# Altium schematic symbol library SparkFun-Aesthetics.SCHLIB: 129 symbols (continued)
## FRAME-LETTERNO_PACKAGE (continued)
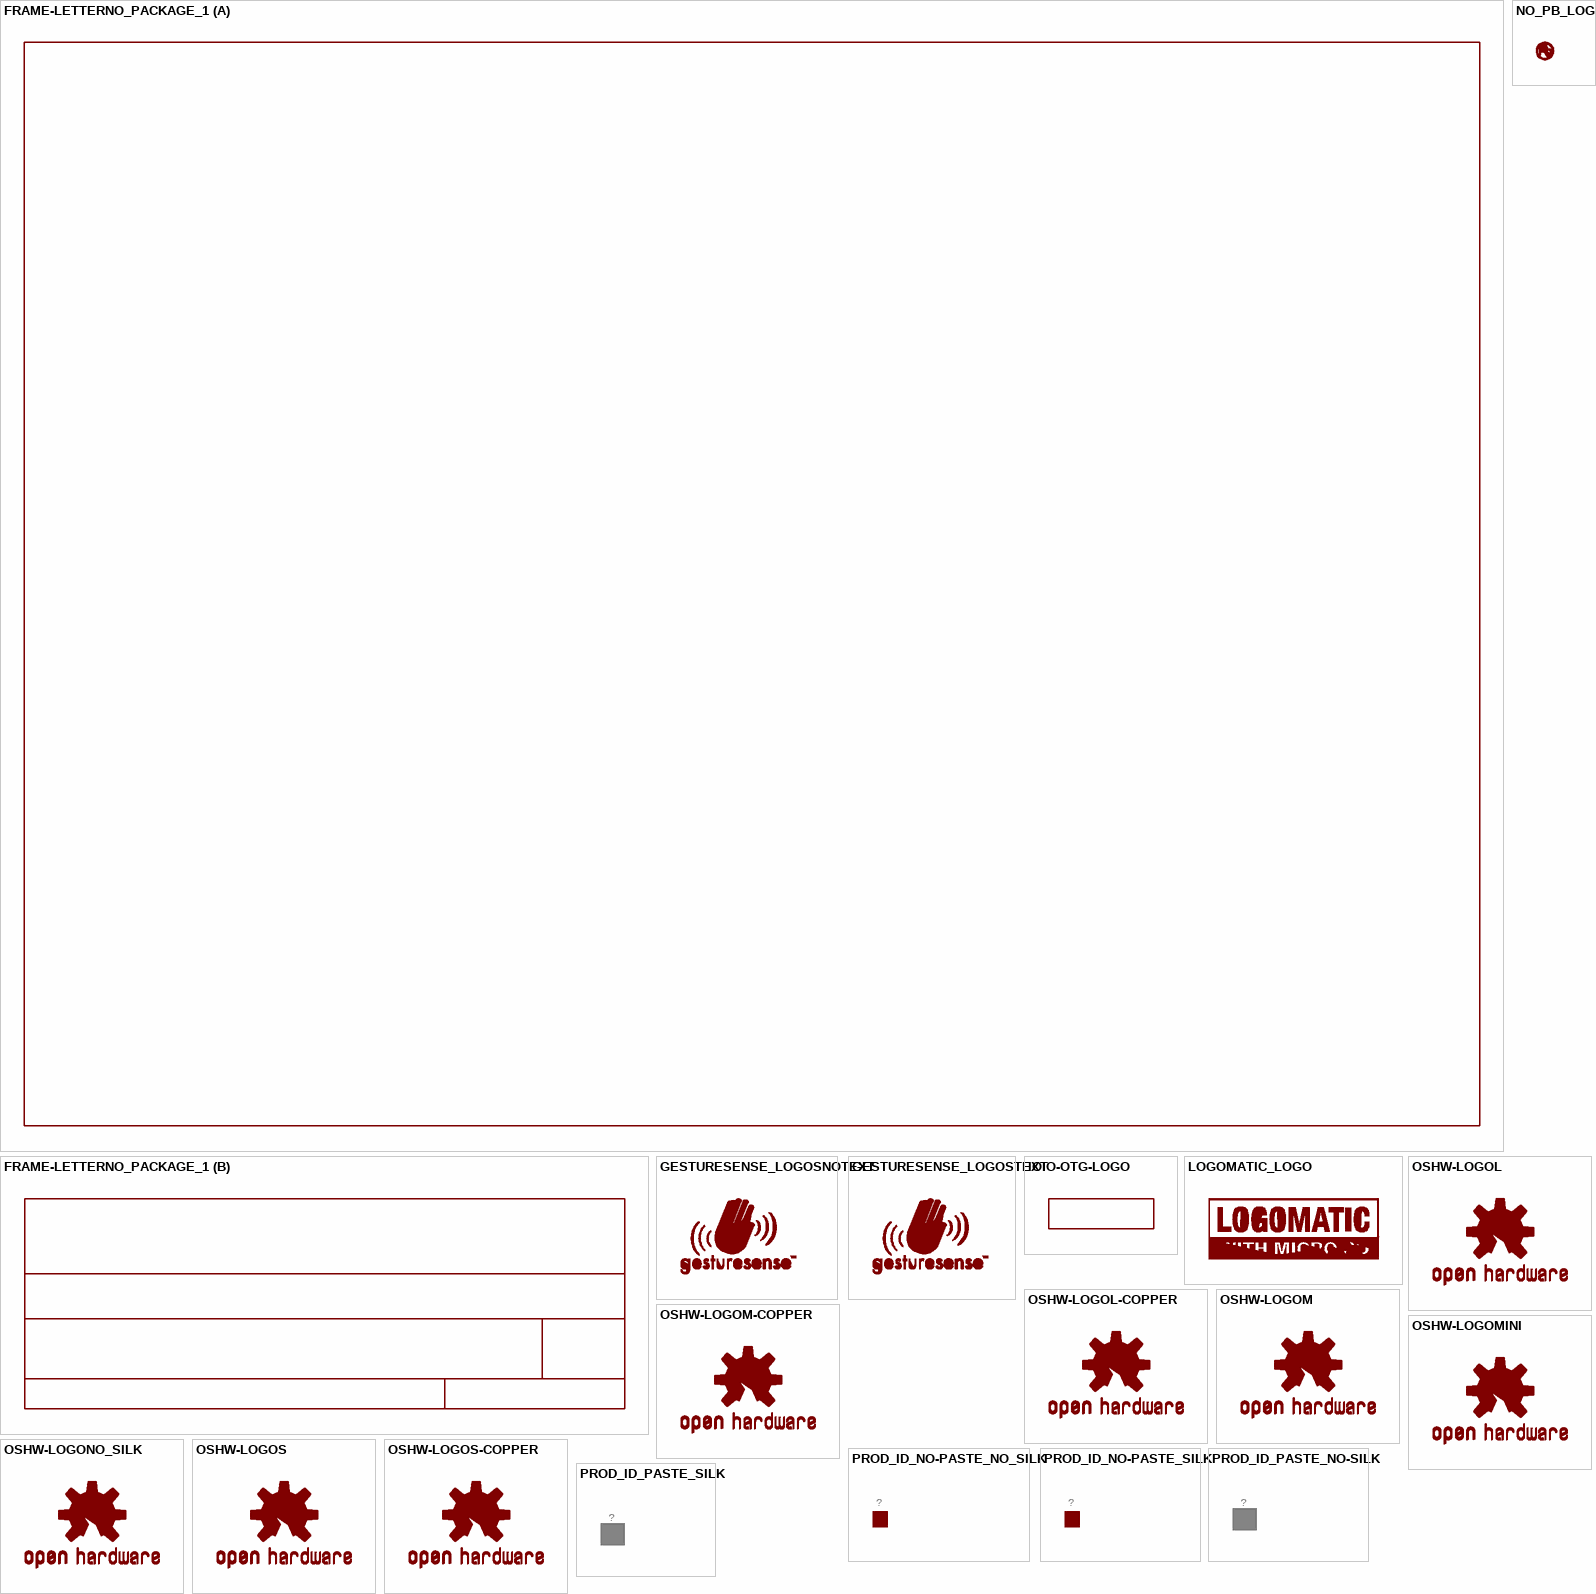
[diagram p8: symbols FRAME-LETTERNO_PACKAGE_1 to PROD_ID_PASTE_SILK]

## FRAME-LETTERNO_PACKAGE_1
designator FRAME?, comment Schematic Frame - Letter    Standard 8.5x11 US Letter frame  (value not drawn)
GateName_1: G$1; GateName_2: V; SymbolName_2: DOCFIELD; DeviceName: NO_PACKAGE; DESIGNER: Nobody; SymbolName_1: FRAME-LETTER; LibraryName: SparkFun-Aesthetics; DeviceSetName: FRAME-LETTER; Package: DUMMY; VERSION: v01
footprint DUMMY

## GESTURESENSE_LOGOSNOTEXT
designator LOGO?, comment GestureSense Logo    Used on the ZX Distance and Gesture Sensor.  (value not drawn)
GateName_1: G$1; DeviceName: NOTEXT; DeviceSetName: GESTURESENSE_LOGOS; SymbolName_1: GESTURESENSE; LibraryName: SparkFun-Aesthetics; Package: GESTURESENSE_NOTEXT
footprint GESTURESENSE_NOTEXT

## GESTURESENSE_LOGOSTEXT
designator LOGO?, comment GestureSense Logo    Used on the ZX Distance and Gesture Sensor.  (value not drawn)
GateName_1: G$1; DeviceName: TEXT; DeviceSetName: GESTURESENSE_LOGOS; SymbolName_1: GESTURESENSE; LibraryName: SparkFun-Aesthetics; Package: GESTURESENSE_TEXT
footprint GESTURESENSE_TEXT

## IOIO-OTG-LOGO
designator LOGO?, comment IOIO OTG Logo - Exposed Copper    Logo used on the SparkFun IOIO-OTG.  (value not drawn)
GateName_1: G$1; DeviceSetName: IOIO-OTG-LOGO; SymbolName_1: IOIO-OTG; LibraryName: SparkFun-Aesthetics; Package: IOIO-OTG-COPPER-EXPOSED
footprint IOIO-OTG-COPPER-EXPOSED

## LOGO-CONTROLLER_BIT
designator ?
GateName_1: G$1; SymbolName_1: LOGO-CONTROLLER_BIT; LibraryName: SparkFun-Aesthetics; DeviceSetName: LOGO-CONTROLLER_BIT; Package: LOGO-CONTROLLER_BIT
footprint LOGO-CONTROLLER_BIT

## LOGOMATIC_LOGO
designator LOGO?, comment SparkFun Logomatic Logo - Silkscreen    Logo used on the SparkFun Logomatic v2.   Silk is .4" by 1.1" Board logo is .4" by 1.1"  (value not drawn)
GateName_1: G$1; SymbolName_1: LOGOMATIC_LOGO; LibraryName: SparkFun-Aesthetics; DeviceSetName: LOGOMATIC_LOGO; Package: LOGOMATIC_LOGO
footprint LOGOMATIC_LOGO

## NO_PB_LOGO
designator LOGO?, comment Lead-Free (No Pb) Logo    Logo for lead-safe certified hardware.  (value not drawn)
GateName_1: G$1; SymbolName_1: NO_PB_LOGO; LibraryName: SparkFun-Aesthetics; DeviceSetName: NO_PB_LOGO; Package: NO_PB_LOGO_0.120
footprint NO_PB_LOGO_0.120

## OSHW-LOGOL
designator LOGO?, comment Open-Source Hardware (OSHW) Logo     This logo indicates the piece of hardware it is found on incorporates a OSHW license and/or adheres to the definition of open source hardware found here: http://freedomdefined.org/OSHW  (value not drawn)
GateName_1: G$1; SymbolName_1: OSHW-LOGO; DeviceName: L; LibraryName: SparkFun-Aesthetics; DeviceSetName: OSHW-LOGO; Package: OSHW-LOGO-L
footprint OSHW-LOGO-L

## OSHW-LOGOL-COPPER
designator LOGO?, comment Open-Source Hardware (OSHW) Logo     This logo indicates the piece of hardware it is found on incorporates a OSHW license and/or adheres to the definition of open source hardware found here: http://freedomdefined.org/OSHW  (value not drawn)
GateName_1: G$1; SymbolName_1: OSHW-LOGO; DeviceName: L-COPPER; LibraryName: SparkFun-Aesthetics; DeviceSetName: OSHW-LOGO; Package: OSHW-LOGO-L_COPPER
footprint OSHW-LOGO-L_COPPER

## OSHW-LOGOM
designator LOGO?, comment Open-Source Hardware (OSHW) Logo     This logo indicates the piece of hardware it is found on incorporates a OSHW license and/or adheres to the definition of open source hardware found here: http://freedomdefined.org/OSHW  (value not drawn)
GateName_1: G$1; SymbolName_1: OSHW-LOGO; DeviceName: M; LibraryName: SparkFun-Aesthetics; DeviceSetName: OSHW-LOGO; Package: OSHW-LOGO-M
footprint OSHW-LOGO-M

## OSHW-LOGOM-COPPER
designator LOGO?, comment Open-Source Hardware (OSHW) Logo     This logo indicates the piece of hardware it is found on incorporates a OSHW license and/or adheres to the definition of open source hardware found here: http://freedomdefined.org/OSHW  (value not drawn)
GateName_1: G$1; SymbolName_1: OSHW-LOGO; DeviceName: M-COPPER; LibraryName: SparkFun-Aesthetics; DeviceSetName: OSHW-LOGO; Package: OSHW-LOGO-M_COPPER
footprint OSHW-LOGO-M_COPPER

## OSHW-LOGOMINI
designator LOGO?, comment Open-Source Hardware (OSHW) Logo     This logo indicates the piece of hardware it is found on incorporates a OSHW license and/or adheres to the definition of open source hardware found here: http://freedomdefined.org/OSHW  (value not drawn)
GateName_1: G$1; SymbolName_1: OSHW-LOGO; DeviceName: MINI; LibraryName: SparkFun-Aesthetics; DeviceSetName: OSHW-LOGO; Package: OSHW-LOGO-MINI
footprint OSHW-LOGO-MINI

## OSHW-LOGONO_SILK
designator LOGO?, comment Open-Source Hardware (OSHW) Logo     This logo indicates the piece of hardware it is found on incorporates a OSHW license and/or adheres to the definition of open source hardware found here: http://freedomdefined.org/OSHW  (value not drawn)
GateName_1: G$1; SymbolName_1: OSHW-LOGO; DeviceName: NO_SILK; LibraryName: SparkFun-Aesthetics; DeviceSetName: OSHW-LOGO; Package: DUMMY
footprint DUMMY

## OSHW-LOGOS
designator LOGO?, comment Open-Source Hardware (OSHW) Logo     This logo indicates the piece of hardware it is found on incorporates a OSHW license and/or adheres to the definition of open source hardware found here: http://freedomdefined.org/OSHW  (value not drawn)
GateName_1: G$1; SymbolName_1: OSHW-LOGO; DeviceName: S; LibraryName: SparkFun-Aesthetics; DeviceSetName: OSHW-LOGO; Package: OSHW-LOGO-S
footprint OSHW-LOGO-S

## OSHW-LOGOS-COPPER
designator LOGO?, comment Open-Source Hardware (OSHW) Logo     This logo indicates the piece of hardware it is found on incorporates a OSHW license and/or adheres to the definition of open source hardware found here: http://freedomdefined.org/OSHW  (value not drawn)
GateName_1: G$1; SymbolName_1: OSHW-LOGO; DeviceName: S-COPPER; LibraryName: SparkFun-Aesthetics; DeviceSetName: OSHW-LOGO; Package: OSHW-LOGO-S_COPPER
footprint OSHW-LOGO-S_COPPER

## PROD_ID_NO-PASTE_NO_SILK
designator ?
GateName_1: G$1; SymbolName_1: PRODUCT_IDENT_NO; DeviceName: _NO_SILK; DeviceSetName: PROD_ID_NO-PASTE; LibraryName: SparkFun-Aesthetics; Package: PRODUCT_IDENT_NO_NO-SILK
footprint PRODUCT_IDENT_NO_NO-SILK

## PROD_ID_NO-PASTE_SILK
designator ?
GateName_1: G$1; SymbolName_1: PRODUCT_IDENT_NO; DeviceName: _SILK; DeviceSetName: PROD_ID_NO-PASTE; LibraryName: SparkFun-Aesthetics; Package: PRODUCT_IDENT_NO_SILK
footprint PRODUCT_IDENT_NO_SILK

## PROD_ID_PASTE_NO-SILK
designator ?
GateName_1: G$1; SymbolName_1: PRODUCT_IDENT_PASTE; DeviceName: _NO-SILK; DeviceSetName: PROD_ID_PASTE; LibraryName: SparkFun-Aesthetics; Package: PRODUCT_IDENT_PASTE_NO-SILK
footprint PRODUCT_IDENT_PASTE_NO-SILK

## PROD_ID_PASTE_SILK
designator ?
GateName_1: G$1; SymbolName_1: PRODUCT_IDENT_PASTE; DeviceName: _SILK; DeviceSetName: PROD_ID_PASTE; LibraryName: SparkFun-Aesthetics; Package: PRODUCT_IDENT_PASTE_SILK
footprint PRODUCT_IDENT_PASTE_SILK

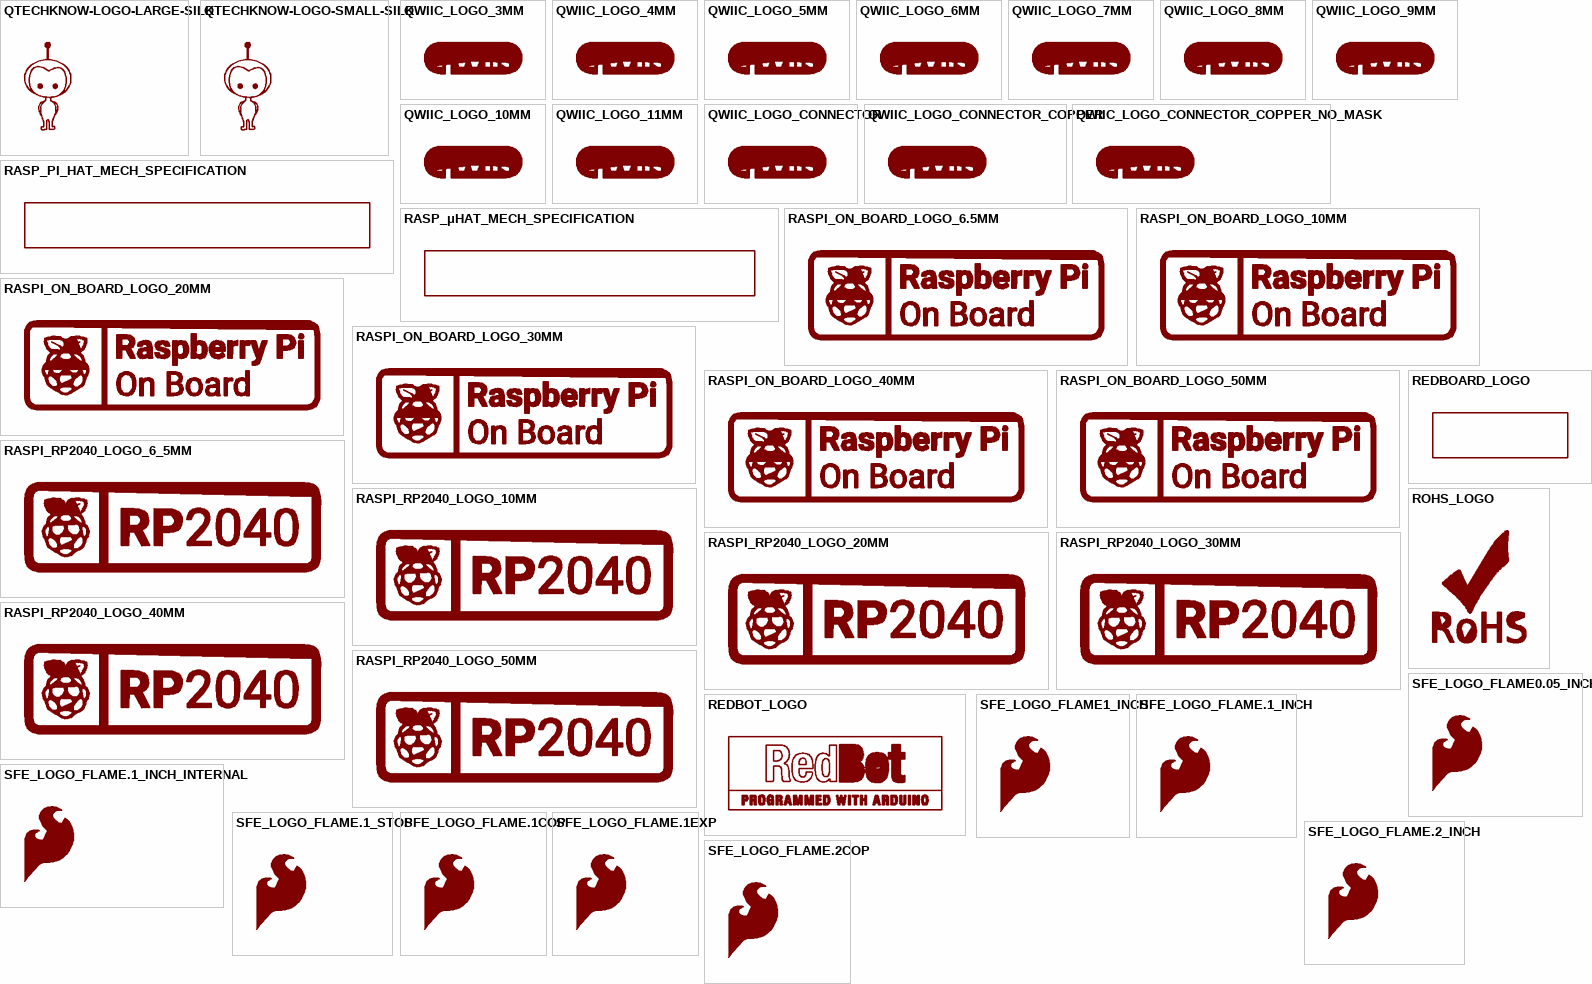
[diagram p9: symbols QTECHKNOW-LOGO-LARGE-SILK to SFE_LOGO_FLAME.2COP]

## QTECHKNOW-LOGO-LARGE-SILK
designator LOGO?, comment Qtechknow "MightyQ" Logo    Silkscreen logo used on the Qduino Mini.  (value not drawn)
GateName_1: G$1; DeviceName: -LARGE-SILK; DeviceSetName: QTECHKNOW-LOGO; SymbolName_1: MIGHTYQ; LibraryName: SparkFun-Aesthetics; Package: QTECHKNOW-LOGO-LARGE-SILK
footprint QTECHKNOW-LOGO-LARGE-SILK

## QTECHKNOW-LOGO-SMALL-SILK
designator LOGO?, comment Qtechknow "MightyQ" Logo    Silkscreen logo used on the Qduino Mini.  (value not drawn)
GateName_1: G$1; DeviceName: -SMALL-SILK; DeviceSetName: QTECHKNOW-LOGO; SymbolName_1: MIGHTYQ; LibraryName: SparkFun-Aesthetics; Package: QTECHKNOW-LOGO-SMALL-SILK
footprint QTECHKNOW-LOGO-SMALL-SILK

## QWIIC_LOGO_3MM
designator LOGO?, comment Qwiic Logos for placement on schematic and PCB. The 5.5mm silk logo is best for placing next to Qwiic connector.  (value not drawn)
GateName_1: G$1; DeviceName: _3MM; DeviceSetName: QWIIC_LOGO; SymbolName_1: LOGO; LibraryName: SparkFun-Aesthetics; Package: QWIIC_3MM
footprint QWIIC_3MM

## QWIIC_LOGO_4MM
designator LOGO?, comment Qwiic Logos for placement on schematic and PCB. The 5.5mm silk logo is best for placing next to Qwiic connector.  (value not drawn)
GateName_1: G$1; DeviceName: _4MM; DeviceSetName: QWIIC_LOGO; SymbolName_1: LOGO; LibraryName: SparkFun-Aesthetics; Package: QWIIC_4MM
footprint QWIIC_4MM

## QWIIC_LOGO_5MM
designator LOGO?, comment Qwiic Logos for placement on schematic and PCB. The 5.5mm silk logo is best for placing next to Qwiic connector.  (value not drawn)
GateName_1: G$1; DeviceName: _5MM; DeviceSetName: QWIIC_LOGO; SymbolName_1: LOGO; LibraryName: SparkFun-Aesthetics; Package: QWIIC_5MM
footprint QWIIC_5MM

## QWIIC_LOGO_6MM
designator LOGO?, comment Qwiic Logos for placement on schematic and PCB. The 5.5mm silk logo is best for placing next to Qwiic connector.  (value not drawn)
GateName_1: G$1; DeviceName: _6MM; DeviceSetName: QWIIC_LOGO; SymbolName_1: LOGO; LibraryName: SparkFun-Aesthetics; Package: QWIIC_6MM
footprint QWIIC_6MM

## QWIIC_LOGO_7MM
designator LOGO?, comment Qwiic Logos for placement on schematic and PCB. The 5.5mm silk logo is best for placing next to Qwiic connector.  (value not drawn)
GateName_1: G$1; DeviceName: _7MM; DeviceSetName: QWIIC_LOGO; SymbolName_1: LOGO; LibraryName: SparkFun-Aesthetics; Package: QWIIC_7MM
footprint QWIIC_7MM

## QWIIC_LOGO_8MM
designator LOGO?, comment Qwiic Logos for placement on schematic and PCB. The 5.5mm silk logo is best for placing next to Qwiic connector.  (value not drawn)
GateName_1: G$1; DeviceName: _8MM; DeviceSetName: QWIIC_LOGO; SymbolName_1: LOGO; LibraryName: SparkFun-Aesthetics; Package: QWIIC_8MM
footprint QWIIC_8MM

## QWIIC_LOGO_9MM
designator LOGO?, comment Qwiic Logos for placement on schematic and PCB. The 5.5mm silk logo is best for placing next to Qwiic connector.  (value not drawn)
GateName_1: G$1; DeviceName: _9MM; DeviceSetName: QWIIC_LOGO; SymbolName_1: LOGO; LibraryName: SparkFun-Aesthetics; Package: QWIIC_9MM
footprint QWIIC_9MM

## QWIIC_LOGO_10MM
designator LOGO?, comment Qwiic Logos for placement on schematic and PCB. The 5.5mm silk logo is best for placing next to Qwiic connector.  (value not drawn)
GateName_1: G$1; DeviceName: _10MM; DeviceSetName: QWIIC_LOGO; SymbolName_1: LOGO; LibraryName: SparkFun-Aesthetics; Package: QWIIC_10MM
footprint QWIIC_10MM

## QWIIC_LOGO_11MM
designator LOGO?, comment Qwiic Logos for placement on schematic and PCB. The 5.5mm silk logo is best for placing next to Qwiic connector.  (value not drawn)
GateName_1: G$1; DeviceName: _11MM; DeviceSetName: QWIIC_LOGO; SymbolName_1: LOGO; LibraryName: SparkFun-Aesthetics; Package: QWIIC_11MM
footprint QWIIC_11MM

## QWIIC_LOGO_CONNECTOR
designator LOGO?, comment Qwiic Logos for placement on schematic and PCB. The 5.5mm silk logo is best for placing next to Qwiic connector.  (value not drawn)
GateName_1: G$1; DeviceName: _CONNECTOR; DeviceSetName: QWIIC_LOGO; SymbolName_1: LOGO; LibraryName: SparkFun-Aesthetics; Package: QWIIC_5.5MM
footprint QWIIC_5.5MM

## QWIIC_LOGO_CONNECTOR_COPPER
designator LOGO?, comment Qwiic Logos for placement on schematic and PCB. The 5.5mm silk logo is best for placing next to Qwiic connector.  (value not drawn)
GateName_1: G$1; DeviceName: _CONNECTOR_COPPER; DeviceSetName: QWIIC_LOGO; SymbolName_1: LOGO; LibraryName: SparkFun-Aesthetics; Package: QWIIC_5.5MM_COPPER
footprint QWIIC_5.5MM_COPPER

## QWIIC_LOGO_CONNECTOR_COPPER_NO_MASK
designator LOGO?, comment Qwiic Logos for placement on schematic and PCB. The 5.5mm silk logo is best for placing next to Qwiic connector.  (value not drawn)
GateName_1: G$1; DeviceName: _CONNECTOR_COPPER_NO_MASK; DeviceSetName: QWIIC_LOGO; SymbolName_1: LOGO; LibraryName: SparkFun-Aesthetics; Package: QWIIC_5.5MM_COPPER_NO_MASK
footprint QWIIC_5.5MM_COPPER_NO_MASK

## RASP_PI_HAT_MECH_SPECIFICATION
designator ?
GateName_1: G$1; SymbolName_1: RASP_PI_HAT_SPECIFICATION; DeviceSetName: RASP_PI_HAT_MECH_SPECIFICATION; LibraryName: SparkFun-Aesthetics; Package: RASP_PI_HAT_SPECIFICATION
footprint RASP_PI_HAT_SPECIFICATION

## RASP_μHAT_MECH_SPECIFICATION
designator ?, comment Mechanical Specification for Raspberry Î¼Hat    The mechanical specification was pulled from their Github page.  (value not drawn)
GateName_1: G$1; SymbolName_1: RASP_μHAT_SPECIFICATION; DeviceSetName: RASP_μHAT_MECH_SPECIFICATION; LibraryName: SparkFun-Aesthetics; Package: RASP_μPI_HAT_SPECIFICATION
footprint RASP_μPI_HAT_SPECIFICATION

## RASPI_ON_BOARD_LOGO_6.5MM
designator ?
GateName_1: G$1; SymbolName_1: RASPI_ON_BOARD_LOGO; DeviceName: _6.5MM; LibraryName: SparkFun-Aesthetics; DeviceSetName: RASPI_ON_BOARD_LOGO; Package: RASPI_ON_BOARD_LOGO_6_5MM
footprint RASPI_ON_BOARD_LOGO_6_5MM

## RASPI_ON_BOARD_LOGO_10MM
designator ?
GateName_1: G$1; SymbolName_1: RASPI_ON_BOARD_LOGO; DeviceName: _10MM; LibraryName: SparkFun-Aesthetics; DeviceSetName: RASPI_ON_BOARD_LOGO; Package: RASPI_ON_BOARD_LOGO_10MM
footprint RASPI_ON_BOARD_LOGO_10MM

## RASPI_ON_BOARD_LOGO_20MM
designator ?
GateName_1: G$1; SymbolName_1: RASPI_ON_BOARD_LOGO; DeviceName: _20MM; LibraryName: SparkFun-Aesthetics; DeviceSetName: RASPI_ON_BOARD_LOGO; Package: RASPI_ON_BOARD_LOGO_20MM
footprint RASPI_ON_BOARD_LOGO_20MM

## RASPI_ON_BOARD_LOGO_30MM
designator ?
GateName_1: G$1; SymbolName_1: RASPI_ON_BOARD_LOGO; DeviceName: _30MM; LibraryName: SparkFun-Aesthetics; DeviceSetName: RASPI_ON_BOARD_LOGO; Package: RASPI_ON_BOARD_LOGO_30MM
footprint RASPI_ON_BOARD_LOGO_30MM

## RASPI_ON_BOARD_LOGO_40MM
designator ?
GateName_1: G$1; SymbolName_1: RASPI_ON_BOARD_LOGO; DeviceName: _40MM; LibraryName: SparkFun-Aesthetics; DeviceSetName: RASPI_ON_BOARD_LOGO; Package: RASPI_ON_BOARD_LOGO_40MM
footprint RASPI_ON_BOARD_LOGO_40MM

## RASPI_ON_BOARD_LOGO_50MM
designator ?
GateName_1: G$1; SymbolName_1: RASPI_ON_BOARD_LOGO; DeviceName: _50MM; LibraryName: SparkFun-Aesthetics; DeviceSetName: RASPI_ON_BOARD_LOGO; Package: RASPI_ON_BOARD_LOGO_50MM
footprint RASPI_ON_BOARD_LOGO_50MM

## RASPI_RP2040_LOGO_6_5MM
designator ?
GateName_1: G$1; SymbolName_1: RASPI_RP2040_LOGO; DeviceName: _6_5MM; LibraryName: SparkFun-Aesthetics; DeviceSetName: RASPI_RP2040_LOGO; Package: RASPI_RP2040_LOGO_6_5MM
footprint RASPI_RP2040_LOGO_6_5MM

## RASPI_RP2040_LOGO_10MM
designator ?
GateName_1: G$1; SymbolName_1: RASPI_RP2040_LOGO; DeviceName: _10MM; LibraryName: SparkFun-Aesthetics; DeviceSetName: RASPI_RP2040_LOGO; Package: RASPI_RP2040_LOGO_10MM
footprint RASPI_RP2040_LOGO_10MM

## RASPI_RP2040_LOGO_20MM
designator ?
GateName_1: G$1; SymbolName_1: RASPI_RP2040_LOGO; DeviceName: _20MM; LibraryName: SparkFun-Aesthetics; DeviceSetName: RASPI_RP2040_LOGO; Package: RASPI_RP2040_LOGO_20MM
footprint RASPI_RP2040_LOGO_20MM

## RASPI_RP2040_LOGO_30MM
designator ?
GateName_1: G$1; SymbolName_1: RASPI_RP2040_LOGO; DeviceName: _30MM; LibraryName: SparkFun-Aesthetics; DeviceSetName: RASPI_RP2040_LOGO; Package: RASPI_RP2040_LOGO_30MM
footprint RASPI_RP2040_LOGO_30MM

## RASPI_RP2040_LOGO_40MM
designator ?
GateName_1: G$1; SymbolName_1: RASPI_RP2040_LOGO; DeviceName: _40MM; LibraryName: SparkFun-Aesthetics; DeviceSetName: RASPI_RP2040_LOGO; Package: RASPI_RP2040_LOGO_40MM
footprint RASPI_RP2040_LOGO_40MM

## RASPI_RP2040_LOGO_50MM
designator ?
GateName_1: G$1; SymbolName_1: RASPI_RP2040_LOGO; DeviceName: _50MM; LibraryName: SparkFun-Aesthetics; DeviceSetName: RASPI_RP2040_LOGO; Package: RASPI_RP2040_LOGO_50MM
footprint RASPI_RP2040_LOGO_50MM

## REDBOARD_LOGO
designator ?
GateName_1: G$1; SymbolName_1: REDBOARD_LOGO; LibraryName: SparkFun-Aesthetics; DeviceSetName: REDBOARD_LOGO; Package: REDBOARD_LOGO
footprint REDBOARD_LOGO

## REDBOT_LOGO
designator LOGO?, comment SparkFun RedBot Logo - Silkscreen    Logo for the RedBot board. Approx. 0.5" high, 1.4" wide. Used on the SparkFun RedBot Mainboard.  (value not drawn)
GateName_1: G$1; SymbolName_1: REDBOT_LOGO; LibraryName: SparkFun-Aesthetics; DeviceSetName: REDBOT_LOGO; Package: REDBOT_LOGO
footprint REDBOT_LOGO

## REVISION
designator LOGO?, comment "Revision By" Text    Preceding text for revisor documentation. Includes schematic text on "symbols" layer, and board text on tDoc.  (value not drawn)
GateName_1: G$1; SymbolName_1: REVISION; LibraryName: SparkFun-Aesthetics; DeviceSetName: REVISION; Package: REVISION
footprint REVISION

## ROHS_LOGO
designator LOGO?, comment Restriction of Hazardous Substances (RoHS) Logo    Logo for RoHS-certified hardware.  (value not drawn)
GateName_1: G$1; SymbolName_1: ROHS_LOGO; LibraryName: SparkFun-Aesthetics; DeviceSetName: ROHS_LOGO; Package: ROHS_LOGO_0.18_IN
footprint ROHS_LOGO_0.18_IN

## SFE_LOGO_FLAME0.05_INCH
designator LOGO?, comment SparkFun Flame Logo    This is the SparkFun flame logo. The logo on the schematic will always be the same size; the package variant is the height of the flame. Default layer for the logo on the board is tSilk.  (value not drawn)
GateName_1: G$1; SymbolName_1: SFE_LOGO_FLAME; DeviceName: 0.05_INCH; LibraryName: SparkFun-Aesthetics; DeviceSetName: SFE_LOGO_FLAME; Package: SFE_LOGO_FLAME_.05
footprint SFE_LOGO_FLAME_.05

## SFE_LOGO_FLAME1_INCH
designator LOGO?, comment SparkFun Flame Logo    This is the SparkFun flame logo. The logo on the schematic will always be the same size; the package variant is the height of the flame. Default layer for the logo on the board is tSilk.  (value not drawn)
GateName_1: G$1; SymbolName_1: SFE_LOGO_FLAME; DeviceName: 1_INCH; LibraryName: SparkFun-Aesthetics; DeviceSetName: SFE_LOGO_FLAME; Package: SFE_LOGO_FLAME_.9
footprint SFE_LOGO_FLAME_.9

## SFE_LOGO_FLAME.1_INCH
designator LOGO?, comment SparkFun Flame Logo    This is the SparkFun flame logo. The logo on the schematic will always be the same size; the package variant is the height of the flame. Default layer for the logo on the board is tSilk.  (value not drawn)
GateName_1: G$1; SymbolName_1: SFE_LOGO_FLAME; DeviceName: .1_INCH; LibraryName: SparkFun-Aesthetics; DeviceSetName: SFE_LOGO_FLAME; Package: SFE_LOGO_FLAME_.1
footprint SFE_LOGO_FLAME_.1

## SFE_LOGO_FLAME.1_INCH_INTERNAL
designator LOGO?, comment SparkFun Flame Logo    This is the SparkFun flame logo. The logo on the schematic will always be the same size; the package variant is the height of the flame. Default layer for the logo on the board is tSilk.  (value not drawn)
GateName_1: G$1; SymbolName_1: SFE_LOGO_FLAME; DeviceName: .1_INCH_INTERNAL; LibraryName: SparkFun-Aesthetics; DeviceSetName: SFE_LOGO_FLAME; Package: SEF_LOGO_FLAME_INTERNAL_.1
footprint SEF_LOGO_FLAME_INTERNAL_.1

## SFE_LOGO_FLAME.1_STOP
designator LOGO?, comment SparkFun Flame Logo    This is the SparkFun flame logo. The logo on the schematic will always be the same size; the package variant is the height of the flame. Default layer for the logo on the board is tSilk.  (value not drawn)
GateName_1: G$1; SymbolName_1: SFE_LOGO_FLAME; DeviceName: .1_STOP; LibraryName: SparkFun-Aesthetics; DeviceSetName: SFE_LOGO_FLAME; Package: SFE_LOGO_FLAME_STOP_.1
footprint SFE_LOGO_FLAME_STOP_.1

## SFE_LOGO_FLAME.1COP
designator LOGO?, comment SparkFun Flame Logo    This is the SparkFun flame logo. The logo on the schematic will always be the same size; the package variant is the height of the flame. Default layer for the logo on the board is tSilk.  (value not drawn)
GateName_1: G$1; SymbolName_1: SFE_LOGO_FLAME; DeviceName: .1COP; LibraryName: SparkFun-Aesthetics; DeviceSetName: SFE_LOGO_FLAME; Package: SFE_LOGO_FLAME_COPPER_.1
footprint SFE_LOGO_FLAME_COPPER_.1

## SFE_LOGO_FLAME.1EXP
designator LOGO?, comment SparkFun Flame Logo    This is the SparkFun flame logo. The logo on the schematic will always be the same size; the package variant is the height of the flame. Default layer for the logo on the board is tSilk.  (value not drawn)
GateName_1: G$1; SymbolName_1: SFE_LOGO_FLAME; DeviceName: .1EXP; LibraryName: SparkFun-Aesthetics; DeviceSetName: SFE_LOGO_FLAME; Package: SFE_LOGO_FLAME_COPPER_EXPOSED_.1
footprint SFE_LOGO_FLAME_COPPER_EXPOSED_.1

## SFE_LOGO_FLAME.2_INCH
designator LOGO?, comment SparkFun Flame Logo    This is the SparkFun flame logo. The logo on the schematic will always be the same size; the package variant is the height of the flame. Default layer for the logo on the board is tSilk.  (value not drawn)
GateName_1: G$1; SymbolName_1: SFE_LOGO_FLAME; DeviceName: .2_INCH; LibraryName: SparkFun-Aesthetics; DeviceSetName: SFE_LOGO_FLAME; Package: SFE_LOGO_FLAME_.2
footprint SFE_LOGO_FLAME_.2

## SFE_LOGO_FLAME.2COP
designator LOGO?, comment SparkFun Flame Logo    This is the SparkFun flame logo. The logo on the schematic will always be the same size; the package variant is the height of the flame. Default layer for the logo on the board is tSilk.  (value not drawn)
GateName_1: G$1; SymbolName_1: SFE_LOGO_FLAME; DeviceName: .2COP; LibraryName: SparkFun-Aesthetics; DeviceSetName: SFE_LOGO_FLAME; Package: SFE_LOGO_FLAME_COPPER_.2
footprint SFE_LOGO_FLAME_COPPER_.2
